# Altium integrated library mcu_prog_and_debug_connectors.IntLib: 8 symbols
Pins are listed as number, name and electrical type; pins without a type are passive.

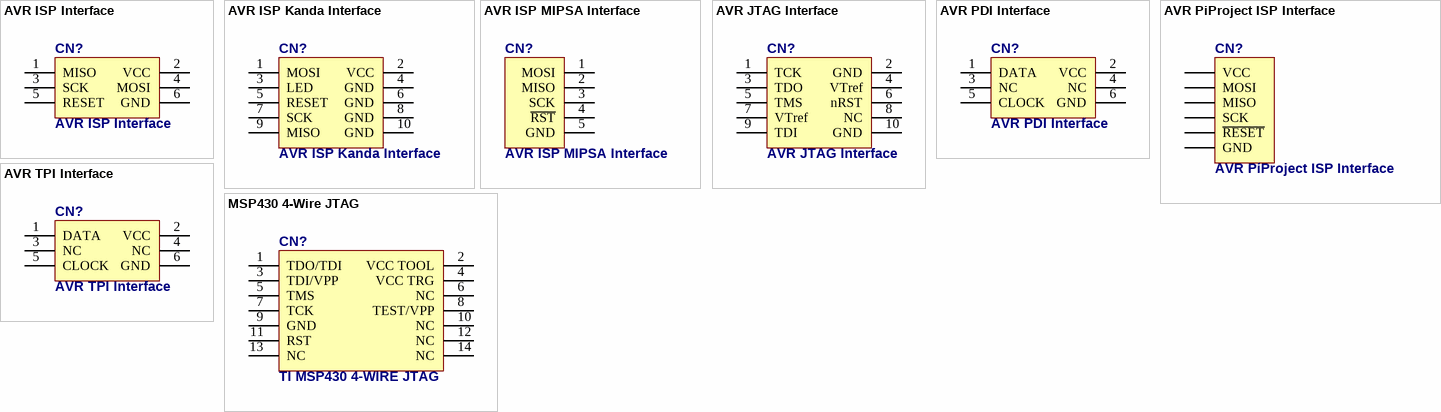
[diagram p0: symbols AVR ISP Interface to MSP430 4-Wire JTAG]

## AVR ISP Interface
designator CN?
ISP Programming Header for AVR MCU's
footprint IDC6 (2x3pin 2,54mm)
footprint GP_3x2
footprint IDC6_RA (2.54mm, 6 Pin IDC Male Connector)
footprint GP_3x2H
footprint GP_3x2H_F
footprint GP_3x2_F
footprint IDC6_SMD (2.54mm, 6 Pin IDC Male Connector, SMD)
pins: 1 MISO, 2 VCC, 3 SCK, 4 MOSI, 5 RESET, 6 GND

## AVR ISP Kanda Interface
designator CN?
Kanda ISP Programming Header for AVR MCU's
footprint IDC10 (2.54mm, 10 Pin IDC Male Connector)
footprint IDC10_RA_1 (2.54mm, 10 Pin IDC Male Connector, Right Angle)
footprint IDC10_SMD (2.54mm, 10 Pin IDC Male Connector, SMD)
footprint GP_5x2
footprint GP_5x2H
footprint GP_5x2_F
footprint GP_5x2H_F
footprint IDC10_RA_2 (2.54mm, 10 Pin IDC Male Connector, Right Angle)
pins: 1 MOSI, 2 VCC, 3 LED, 4 GND, 5 RESET, 6 GND, 7 SCK, 8 GND, 9 MISO, 10 GND

## AVR ISP MIPSA Interface
designator CN?
MIPSA ISP Programming Header for AVR MCU's
footprint KK/2.54/5_manual
footprint KK/2.54/5
footprint KK/2.54/5_laying_manual
pins: 1 MOSI "MOSI Line", 2 MISO "MOSI Line", 3 SCK "MOSI Line", 4 ~{RST} "MOSI Line", 5 GND (power) "MOSI Line"

## AVR JTAG Interface
designator CN?
JTAG Header for AVR MCU's
footprint IDC10 (2.54mm, 10 Pin IDC Male Connector)
footprint IDC10_RA_1 (2.54mm, 10 Pin IDC Male Connector, Right Angle)
footprint IDC10_SMD (2.54mm, 10 Pin IDC Male Connector, SMD)
footprint IDC10_RA_2 (2.54mm, 10 Pin IDC Male Connector, Right Angle)
pins: 1 TCK, 2 GND, 3 TDO, 4 VTref, 5 TMS, 6 nRST, 7 VTref, 8 NC, 9 TDI, 10 GND

## AVR PDI Interface
designator CN?
PDI Programming Header for AVR MCU's
footprint IDC6 (2x3pin 2,54mm)
footprint GP_3x2
footprint IDC6_RA (2.54mm, 6 Pin IDC Male Connector)
footprint GP_3x2H
pins: 1 DATA, 2 VCC, 3 NC, 4 NC, 5 CLOCK, 6 GND

## AVR PiProject ISP Interface
designator CN?
PiProject ISP Programming Header for AVR MCU's; Published: 20-Mar-2006; PackageReference: HU06
footprint KK/2.54/6
footprint KK/2.54/6_manual
pins: 1 VCC, 2 MOSI, 3 MISO, 4 SCK, 5 ~{RESET}, 6 GND

## AVR TPI Interface
designator CN?
TPI Programming Header for tinyAVR MCU's
footprint IDC6 (2x3pin 2,54mm)
footprint GP_3x2
footprint IDC6_RA (2.54mm, 6 Pin IDC Male Connector)
footprint GP_3x2H
pins: 1 DATA, 2 VCC, 3 NC, 4 NC, 5 CLOCK, 6 GND

## MSP430 4-Wire JTAG
designator CN?, comment TI MSP430 4-WIRE JTAG
Texas Instruments MSP430 4-Wire JTAG Connector
footprint IDC14 (2.54mm, 14 Pin IDC Male Connector)
footprint IDC14_RA (2.54mm, 14 Pin IDC Male Connector, Right Angle)
pins: 1 TDO/TDI, 2 VCC TOOL, 3 TDI/VPP, 4 VCC TRG, 5 TMS, 6 NC, 7 TCK, 8 TEST/VPP, 9 GND, 10 NC, 11 RST, 12 NC, 13 NC, 14 NC